# Altium footprint library 1.05-直插电感、共模电感.PcbLib: 35 footprints (part 2 of 3)
Each footprint in its own frame and in the unit in brackets; x right, y up, seen from the top. Pads: shape width x height; smd on the part's side, far side on the other; paste and mask are expansions set on the pad; w line width, h text height; cw(c..) or ccw(c..) is an arc to the next point about the centre after c.
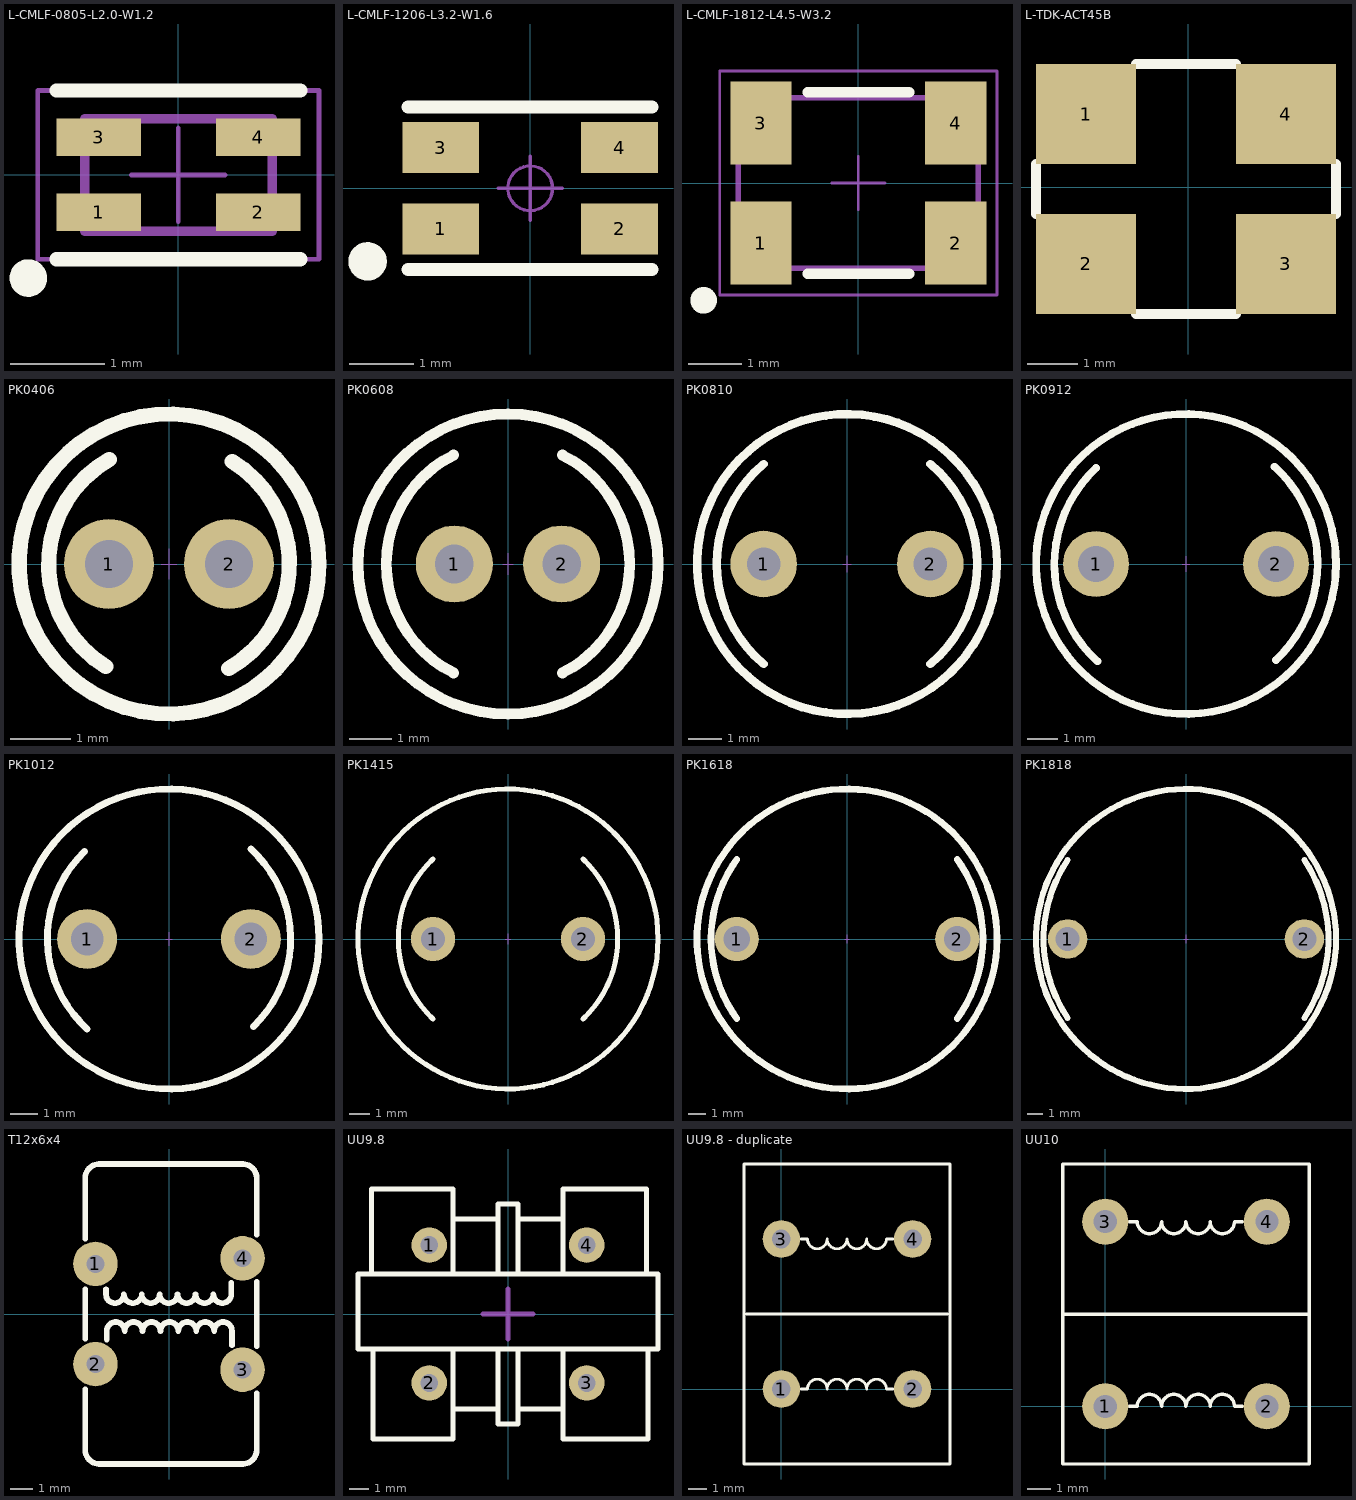
[diagram p1: the footprints below, top view; thin cyan lines are the x and y axes]

## L-CMLF-0805-L2.0-W1.2 [mm] "SMT Common Mode Line Filter, 4-leads, body 2x1.2mm"
height 1.2
pads (4):
  rect 0.9x0.4 smd: 1(-0.85,-0.4) 2(0.85,-0.4) 3(-0.85,0.4) 4(0.85,0.4)
Top Overlay:
  circle w0.2: c-1.6,-1.1 r0.1
  lines w0.152: -1.3,-0.9 1.3,-0.9 ; -1.3,0.9 1.3,0.9
Mechanical 13:
  lines w0.1: -1,-0.6 1,-0.6 1,0.6 -1,0.6 -1,-0.6
Mechanical 15:
  lines w0.05: -0.5,0 0.5,0 ; 0,-0.5 0,0.5 ; -1.5,-0.9 -1.5,0.9 1.5,0.9 1.5,-0.9 -1.5,-0.9
3D body: height 1.16, standoff -0.04, extent -1,-0.6 1,0.6

## L-CMLF-1206-L3.2-W1.6 [mm] "SMT Common Mode Line Filter, 4-leads, body 3.2x1.6mm"
pads (4):
  rect 1.2x0.8 smd: 1(-1.397,-0.635) 2(1.397,-0.635) 3(-1.397,0.635) 4(1.397,0.635)
Top Overlay:
  circle w0.3: c-2.54,-1.143 r0.15
  lines w0.203: -1.905,-1.27 1.905,-1.27 ; -1.905,1.27 1.905,1.27
Mechanical 15:
  circle w0.05: c0,0 r0.35
  lines w0.05: -0.5,0 0.5,0 ; 0,-0.5 0,0.5
3D body: height 2, standoff -0.01, extent -1.61,-0.81 1.61,0.81

## L-CMLF-1812-L4.5-W3.2 [mm] "SMT Common Mode Line Filter, 4-leads, body 4.5x3.2mm"
height 2.8
pads (4):
  rect 1.15x1.55 smd: 1(-1.825,-1.125) 2(1.825,-1.125) 3(-1.825,1.125) 4(1.825,1.125)
Top Overlay:
  circle w0.25: c-2.9,-2.2 r0.125
  lines w0.2: -0.95,-1.7 0.95,-1.7 ; -0.95,1.7 0.95,1.7
Mechanical 13:
  lines w0.1: -2.25,-1.6 2.25,-1.6 2.25,1.6 -2.25,1.6 -2.25,-1.6
Mechanical 15:
  lines w0.05: -0.5,0 0.5,0 ; 0,-0.5 0,0.5 ; -2.6,-2.1 -2.6,2.1 2.6,2.1 2.6,-2.1 -2.6,-2.1
3D body: height 2.87, standoff 0.01, extent -2.25,-1.6 2.25,1.6

## L-TDK-ACT45B [mm]
height 10
pads (4):
  rect 2x2 smd: 1(-2.048,1.46) 2(-2.048,-1.54) 3(1.952,-1.54) 4(1.952,1.46)
Top Overlay:
  lines w0.2: -3.048,-0.54 -3.048,0.46 ; -1.048,-2.54 0.952,-2.54 ; -1.048,2.46 0.952,2.46 ; 2.952,-0.54 2.952,0.46
3D body: height 2.87, standoff 0.01, extent -2.25,-1.6 2.25,1.6

## PK0406 [mm] "2*5*8mm(脚距，直径，高）"
pads (2):
  round 1.5 hole 0.8: 1(-1,0) 2(1,0)
Top Overlay:
  circle w0.254: c0,0 r2.5
  lines w0.254: -1.052,-1.71 cw(c0,0) -0.996,1.743 ; 0.996,-1.743 ccw(c0,0) 1.052,1.71
Mechanical 15:
  lines w0.01: -0.127,0 0.127,0 ; 0,-0.254 0,0.254
3D body: height 8.02, standoff -2.78, extent -2.5,-2.5 2.5,2.5

## PK0608 [mm] "2.5*7*10mm(脚距，直径，高）"
pads (2):
  round 1.8 hole 0.9: 1(-1.25,0) 2(1.25,0)
Top Overlay:
  circle w0.254: c0,0 r3.5
  lines w0.254: -1.27,-2.54 cw(c0,0) -1.27,2.54 ; 1.27,-2.54 ccw(c0,0) 1.27,2.54
Mechanical 15:
  lines w0.01: -0.127,0 0.127,0 ; 0,-0.254 0,0.254
3D body: height 10.02, standoff -2.78, extent -3.5,-3.5 3.5,3.5

## PK0810 [mm] "5*9*12mm(脚距，直径，高）"
pads (2):
  round 2 hole 1: 1(-2.5,0) 2(2.5,0)
Top Overlay:
  circle w0.254: c0,0 r4.5
  lines w0.254: -2.5,-3 cw(c0,0) -2.5,3 ; 2.5,-3 ccw(c0,0) 2.5,3
Mechanical 15:
  lines w0.01: -0.127,0 0.127,0 ; 0,-0.254 0,0.254
3D body: height 12.02, standoff -2.78, extent -4.5,-4.5 4.5,4.5

## PK0912 [mm] "6*10*14mm(脚距，直径，高）          淘宝ID:黄晶宝石"
pads (2):
  round 2.2 hole 1.2: 1(-3,0) 2(3,0)
Top Overlay:
  circle w0.254: c0,0 r5
  lines w0.254: -3,3.2 ccw(c0,0) -2.951,-3.246 ; 2.951,3.246 cw(c0,0) 3,-3.2
Mechanical 15:
  lines w0.01: -0.127,0 0.127,0 ; 0,-0.254 0,0.254
3D body: height 14.02, standoff -2.78, extent -5,-5 5,5

## PK1012 [mm] "6*11*14mm(脚距，直径，高）"
pads (2):
  round 2.2 hole 1.2: 1(-3,0) 2(3,0)
Top Overlay:
  circle w0.254: c0,0 r5.5
  lines w0.254: -3.101,3.205 ccw(c0,0) -3,-3.3 ; 3,3.3 cw(c0,0) 3.101,-3.205
Mechanical 15:
  lines w0.01: -0.127,0 0.127,0 ; 0,-0.254 0,0.254
3D body: height 2.28, standoff -14.52, extent -5.5,-5.5 5.5,5.5

## PK1415 [mm] "7.5*15*17mm(脚距，直径，高）"
pads (2):
  round 2.2 hole 1.2: 1(-3.75,0) 2(3.75,0)
Top Overlay:
  circle w0.254: c0,0 r7.5
  lines w0.254: -3.75,-4 cw(c0,0) -3.75,4 ; 3.75,-4 ccw(c0,0) 3.75,4
Mechanical 15:
  lines w0.01: -0.127,0 0.127,0 ; 0,-0.254 0,0.254
3D body: height 2.28, standoff -17.52, extent -7.5,-7.5 7.5,7.5

## PK1618 [mm] "12.5*17*20mm(脚距，直径，高）"
pads (2):
  round 2.5 hole 1.5: 1(-6.25,0) 2(6.25,0)
Top Overlay:
  circle w0.381: c0,0 r8.5
  lines w0.381: -6.25,-4.5 cw(c0,0) -6.25,4.5 ; 6.25,-4.5 ccw(c0,0) 6.25,4.5
Mechanical 15:
  lines w0.01: -0.127,0 0.127,0 ; 0,-0.254 0,0.254
3D body: height 0, standoff 0, extent 0,0 0,0
3D body: height 2.28, standoff -20.52, extent -8.5,-8.5 8.5,8.5

## PK1818 [mm] "15*19*20mm(脚距，直径，高）"
pads (2):
  round 2.5 hole 1.5: 1(-7.5,0) 2(7.5,0)
Top Overlay:
  circle w0.381: c0,0 r9.5
  lines w0.381: -7.5,-5 cw(c0,0) -7.5,5 ; 7.5,-5 ccw(c0,0) 7.5,5
Mechanical 15:
  lines w0.01: -0.127,0 0.127,0 ; 0,-0.254 0,0.254
3D body: height 2.28, standoff -20.52, extent -9.5,-9.5 9.5,9.5

## T12x6x4 [mm] "直径：13.2mm，厚：7.2mm，脚距5*6.6mm"
pads (4):
  round 2 hole 0.8: 1(-3.3,2.25) 2(-3.3,-2.25) 3(3.3,-2.5) 4(3.3,2.5)
Top Overlay:
  lines w0.254: -3.759,-3.378 -3.759,-6.096 ccw(c-3.124,-6.096) -3.124,-6.731 3.175,-6.731 3.302,-6.731 ccw(c3.302,-6.096) 3.937,-6.096 3.937,-3.556 ; -3.759,-1.118 -3.759,0.584 -3.759,1.118 ; -3.759,3.378 -3.759,6.096 cw(c-3.124,6.096) -3.124,6.731 3.175,6.731 3.302,6.731 cw(c3.302,6.096) 3.937,6.096 3.937,3.556 ; -2.829,1.108 -2.829,0.889 ccw(c-2.427,0.889) -2.025,0.889 ccw(c-1.624,0.889) -1.222,0.889 ccw(c-0.82,0.889) -0.419,0.889 ccw(c-0.017,0.889) 0.384,0.889 ccw(c0.786,0.889) 1.188,0.889 ccw(c1.589,0.889) 1.991,0.889 ccw(c2.392,0.889) 2.794,0.889 2.794,1.397 ; -2.794,-1.143 -2.794,-0.762 cw(c-2.392,-0.762) -1.991,-0.762 cw(c-1.589,-0.762) -1.188,-0.762 cw(c-0.786,-0.762) -0.384,-0.762 cw(c0.017,-0.762) 0.419,-0.762 cw(c0.82,-0.762) 1.222,-0.762 cw(c1.624,-0.762) 2.025,-0.762 cw(c2.427,-0.762) 2.829,-0.762 2.829,-1.397 ; 3.937,-1.448 3.937,0.914 3.937,1.448
3D body: height 3.03, standoff -12.5, extent -3.61,-6.603 3.79,6.603

## UU9.8 [mm] "17*12*17mm(长宽高）"
pads (4):
  round 1.8 hole 0.9: 1(-4,3.5) 2(-4,-3.5) 3(4,-3.5) 4(4,3.5)
Top Overlay:
  lines w0.254: -6.943,2.032 -6.943,6.35 -2.794,6.35 -2.794,2.032 ; -6.858,-1.778 -6.858,-6.35 -2.794,-6.35 -2.794,-1.778 ; -2.794,-4.826 -0.638,-4.826 ; -2.794,4.826 -0.508,4.826 ; -0.508,-1.778 -0.508,-5.588 0.508,-5.588 0.508,-1.778 ; -0.508,2.032 -0.508,5.588 0.508,5.588 0.508,2.032 ; 0.508,-4.826 2.794,-4.826 ; 0.508,4.826 2.794,4.826 ; 2.794,-1.778 2.794,-6.35 7.112,-6.35 7.112,-1.778 ; 2.794,2.032 2.794,6.35 7.027,6.35 7.027,2.032 ; -7.62,-1.778 -7.62,2.032 7.62,2.032 7.62,-1.778 -7.62,-1.778
Mechanical 15:
  lines w0.254: -1.27,0 1.27,0 ; 0,-1.27 0,1.27
3D body: height 3, standoff -17.5, extent -8.5,-6 8.5,6

## UU9.8 - duplicate [mm] "联系卖家 免费查找封装"
pads (4):
  round 2 hole 1: 1(0,0) 2(7,0) 3(0,8) 4(7,8)
Top Overlay:
  lines w0.15: -2,-4 9,-4 ; -2,-3.991 -2,12 9,12 9,-3.991 ; -1.851,3.998 8.847,3.998 ; 1.045,-0.007 1.388,-0.007 cw(c1.915,-0.007) 2.442,-0.007 cw(c2.969,-0.007) 3.496,-0.007 cw(c4.023,-0.007) 4.55,-0.007 cw(c5.077,-0.007) 5.604,-0.007 5.947,-0.007 ; 1.045,8.007 1.388,8.007 ccw(c1.915,8.007) 2.442,8.007 ccw(c2.969,8.007) 3.496,8.007 ccw(c4.023,8.007) 4.55,8.007 ccw(c5.077,8.007) 5.604,8.007 5.947,8.007
3D body: height 16.04, standoff -2.96, extent -1.75,-3.746 8.75,11.755

## UU10 [mm] "联系卖家 免费查找封装"
pads (4):
  round 2 hole 1: 1(0,0) 2(7,0) 3(0,8) 4(7,8)
Top Overlay:
  lines w0.15: -1.851,3.998 8.847,3.998 ; -1.851,10.5 -1.847,-2.5 8.847,-2.5 8.847,10.5 -1.847,10.5 ; 1.045,-0.007 1.388,-0.007 cw(c1.915,-0.007) 2.442,-0.007 cw(c2.969,-0.007) 3.496,-0.007 cw(c4.023,-0.007) 4.55,-0.007 cw(c5.077,-0.007) 5.604,-0.007 5.947,-0.007 ; 1.045,8.007 1.388,8.007 ccw(c1.915,8.007) 2.442,8.007 ccw(c2.969,8.007) 3.496,8.007 ccw(c4.023,8.007) 4.55,8.007 ccw(c5.077,8.007) 5.604,8.007 5.947,8.007
3D body: height 15.45, standoff -3, extent -1.925,-3.782 8.925,11.782